# Altium footprint library JL_PCB.PCBLIB: 1129 footprints (part 15 of 72)
Each footprint in its own frame and in the unit in brackets; x right, y up, seen from the top. Pads: shape width x height; smd on the part's side, far side on the other; paste and mask are expansions set on the pad; w line width, h text height; cw(c..) or ccw(c..) is an arc to the next point about the centre after c.
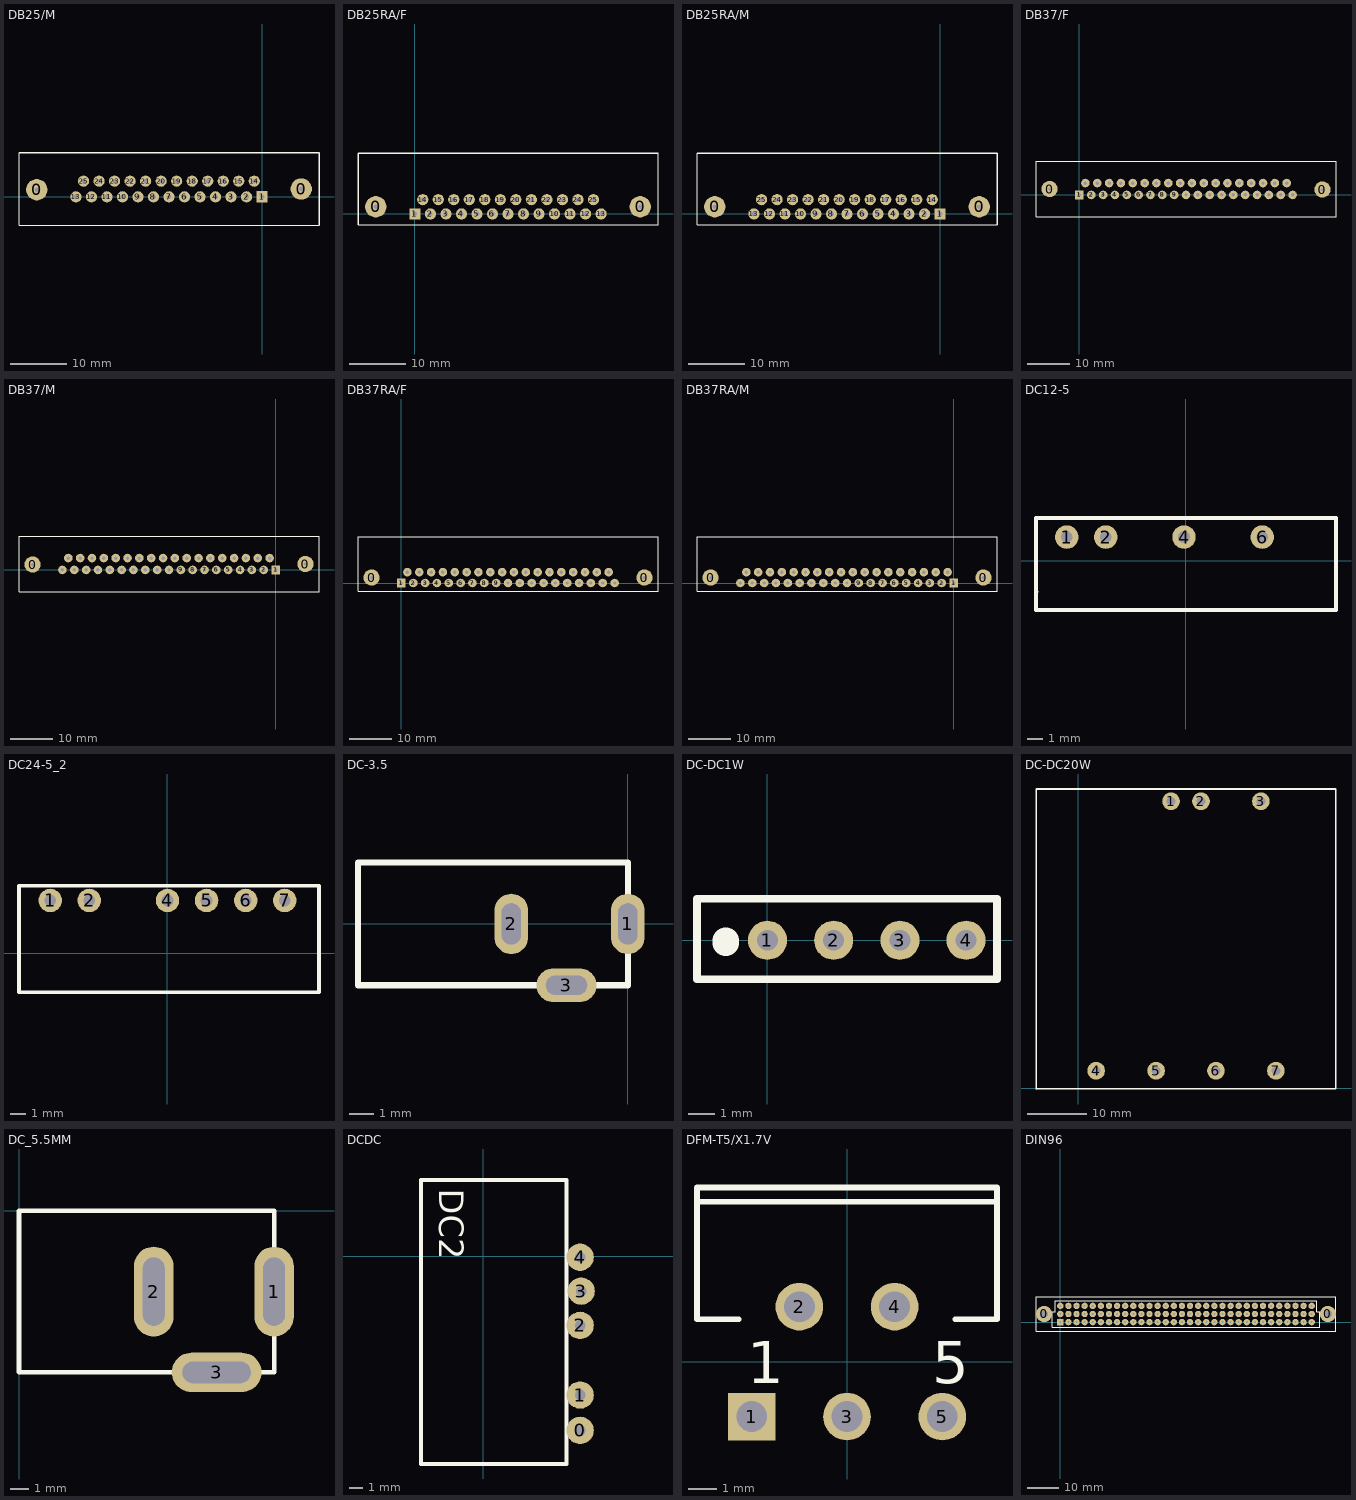
[diagram p14: the footprints below, top view; thin cyan lines are the x and y axes]

## DB25/M [mil]
pads (27):
  round 150 hole 32: 0(-1583,50) 0(275,55)
  rect 78.74x78.74 hole 32: 1(0,0)
  round 78.74 hole 32: 2(-109,0) 3(-218,0) 4(-327,0) 5(-436,0) 6(-545,0) 7(-654,0) 8(-763,0) 9(-872,0) 10(-981,0) 11(-1090,0) 12(-1199,0) 13(-1308,0) 14(-55,110) 15(-164,110) 16(-273,110) 17(-382,110) 18(-491,110) 19(-600,110) 20(-709,110) 21(-818,110) 22(-927,110) 23(-1036,110) 24(-1145,110) 25(-1254,110)
TopOverlay:
  lines w8: -1708,310 -1708,-200 400,-200
  lines w10: -1708,310 400,310 400,-200
3D body "CircuitWorks-DB25_M.step": height 487.22, standoff -137.19, extent -1708.04,-201 412.04,310.81

## DB25RA/F [mil]
pads (27):
  round 150 hole 32: 0(-275,50) 0(1583,50)
  rect 78.74x78.74 hole 32: 1(0,0)
  round 78.74 hole 32: 2(109,0) 3(218,0) 4(327,0) 5(436,0) 6(545,0) 7(654,0) 8(763,0) 9(872,0) 10(981,0) 11(1090,0) 12(1199,0) 13(1308,0) 14(55,100) 15(164,100) 16(273,100) 17(382,100) 18(491,100) 19(600,100) 20(709,100) 21(818,100) 22(927,100) 23(1036,100) 24(1145,100) 25(1254,100)
TopOverlay:
  lines w8: -400,-75 1708,-75 1708,425
  lines w10: -400,-75 -400,425 1708,425
3D body "CircuitWorks-DB25RA_F.step": height 500.6, standoff -99.4, extent -398.99,-64.68 1706.12,659.73

## DB25RA/M [mil]
pads (27):
  round 150 hole 32: 0(-1583,50) 0(275,50)
  rect 78.74x78.74 hole 32: 1(0,0)
  round 78.74 hole 32: 2(-109,0) 3(-218,0) 4(-327,0) 5(-436,0) 6(-545,0) 7(-654,0) 8(-763,0) 9(-872,0) 10(-981,0) 11(-1090,0) 12(-1199,0) 13(-1308,0) 14(-55,100) 15(-164,100) 16(-273,100) 17(-382,100) 18(-491,100) 19(-600,100) 20(-709,100) 21(-818,100) 22(-927,100) 23(-1036,100) 24(-1145,100) 25(-1254,100)
TopOverlay:
  lines w8: -1708,425 -1708,-75 400,-75
  lines w10: -1708,425 400,425 400,-75
3D body "CircuitWorks-DB25RA_M.step": height 500.6, standoff -176.56, extent -1707.56,-69 397.56,655.41

## DB37/F [mil]
pads (39):
  round 150 hole 32: 0(-275,55) 0(2237,50)
  rect 78.74x78.74 hole 32: 1(0,0)
  round 78.74 hole 32: 2(109,0) 3(218,0) 4(327,0) 5(436,0) 6(545,0) 7(654,0) 8(763,0) 9(872,0) 10(981,0) 11(1090,0) 12(1199,0) 13(1308,0) 14(1417,0) 15(1526,0) 16(1635,0) 17(1744,0) 18(1853,0) 19(1962,0) 20(55,110) 21(164,110) 22(273,110) 23(382,110) 24(491,110) 25(600,110) 26(709,110) 27(818,110) 28(927,110) 29(1036,110) 30(1145,110) 31(1254,110) 32(1363,110) 33(1472,110) 34(1581,110) 35(1690,110) 36(1799,110) 37(1908,110)
TopOverlay:
  lines w8: -400,-200 2362,-200 2362,310
  lines w10: -400,-200 -400,310 2362,310

## DB37/M [mil]
pads (39):
  round 150 hole 32: 0(-2237,50) 0(275,55)
  rect 78.74x78.74 hole 32: 1(0,0)
  round 78.74 hole 32: 2(-109,0) 3(-218,0) 4(-327,0) 5(-436,0) 6(-545,0) 7(-654,0) 8(-763,0) 9(-872,0) 10(-981,0) 11(-1090,0) 12(-1199,0) 13(-1308,0) 14(-1417,0) 15(-1526,0) 16(-1635,0) 17(-1744,0) 18(-1853,0) 19(-1962,0) 20(-55,110) 21(-164,110) 22(-273,110) 23(-382,110) 24(-491,110) 25(-600,110) 26(-709,110) 27(-818,110) 28(-927,110) 29(-1036,110) 30(-1145,110) 31(-1254,110) 32(-1363,110) 33(-1472,110) 34(-1581,110) 35(-1690,110) 36(-1799,110) 37(-1908,110)
TopOverlay:
  lines w8: -2362,310 -2362,-200 400,-200
  lines w10: -2362,310 400,310 400,-200
3D body "User Library-DB37.step": height 471.6, standoff -119.4, extent -2348,-197 382,297

## DB37RA/F [mil]
pads (39):
  round 150 hole 32: 0(-275,50) 0(2237,50)
  rect 78.74x78.74 hole 32: 1(0,0)
  round 78.74 hole 32: 2(109,0) 3(218,0) 4(327,0) 5(436,0) 6(545,0) 7(654,0) 8(763,0) 9(872,0) 10(981,0) 11(1090,0) 12(1199,0) 13(1308,0) 14(1417,0) 15(1526,0) 16(1635,0) 17(1744,0) 18(1853,0) 19(1962,0) 20(55,100) 21(164,100) 22(273,100) 23(382,100) 24(491,100) 25(600,100) 26(709,100) 27(818,100) 28(927,100) 29(1036,100) 30(1145,100) 31(1254,100) 32(1363,100) 33(1472,100) 34(1581,100) 35(1690,100) 36(1799,100) 37(1908,100)
TopOverlay:
  lines w8: -400,-75 2362,-75 2362,425
  lines w10: -400,-75 -400,425 2362,425
3D body "CircuitWorks-DB37RA_F.step": height 500.6, standoff -99.4, extent -399.99,-80 2360.01,470

## DB37RA/M [mil]
pads (39):
  round 150 hole 32: 0(-2237,50) 0(275,50)
  rect 78.74x78.74 hole 32: 1(0,0)
  round 78.74 hole 32: 2(-109,0) 3(-218,0) 4(-327,0) 5(-436,0) 6(-545,0) 7(-654,0) 8(-763,0) 9(-872,0) 10(-981,0) 11(-1090,0) 12(-1199,0) 13(-1308,0) 14(-1417,0) 15(-1526,0) 16(-1635,0) 17(-1744,0) 18(-1853,0) 19(-1962,0) 20(-55,100) 21(-164,100) 22(-273,100) 23(-382,100) 24(-491,100) 25(-600,100) 26(-709,100) 27(-818,100) 28(-927,100) 29(-1036,100) 30(-1145,100) 31(-1254,100) 32(-1363,100) 33(-1472,100) 34(-1581,100) 35(-1690,100) 36(-1799,100) 37(-1908,100)
TopOverlay:
  lines w8: -2362,425 -2362,-75 400,-75
  lines w10: -2362,425 400,425 400,-75
3D body "CircuitWorks-DB37M.step": height 500.6, standoff -99.4, extent -2357,-50 385,858

## DC12-5 [mil]
pads (4):
  round 60 hole 30: 1(-305,60) 2(-205,60) 4(-5,60) 6(195,60)
TopOverlay:
  lines w10: -383.74,-78.74 -382.48,-80 ; -383.74,-127.01 383.98,-127.01 383.98,109.21 -383.74,109.21 -383.74,-127.01

## DC24-5_2 [mil]
pads (6):
  round 60 hole 30: 1(-300,135) 2(-200,135) 4(0,135) 5(100,135) 6(200,135) 7(300,135)
TopOverlay:
  lines w10: -380,-100 387.72,-100 387.72,172.72 -380,172.72 -380,-100

## DC-3.5 [mm]
pads (3):
  oval 1.4x2.5 hole 0.8 slot 1.7 at 90 deg: 1(0,0) 2(-4.826,0)
  oval 2.5x1.4 hole 0.8 slot 1.7 at 0 deg: 3(-2.54,-2.54)
TopOverlay:
  lines w0.254: -11.176,-2.54 -11.176,2.54 0,2.54 0,-2.54 -11.176,-2.54
3D body "User Library-DC jack.STEP": height 7.2, standoff -3, extent -11.1,-2.979 0,2.471

## DC-DC1W [mm]
pads (4):
  round 1.5 hole 0.8: 1(0,0) 2(2.54,0) 3(5.08,0) 4(7.62,0)
TopOverlay:
  lines w0.305: -2.702,-1.494 -2.702,1.594 8.804,1.594 8.804,-1.494 -2.702,-1.494
  lines w1: -1.6,-0.1 -1.6,0

## DC-DC20W [mm]
pads (7):
  round 3 hole 1.5: 1(15.748,48.72) 2(20.828,48.72) 3(30.988,48.72) 4(3.048,3) 5(13.208,3) 6(23.368,3) 7(33.528,3)
TopOverlay:
  lines w0.305: -7.118,-0.1 43.688,0 43.688,50.8 -7.112,50.8 -7.118,-0.1

## DC_5.5MM [mm]
pads (3):
  oval 2.2x5 hole 1.2 slot 3.8 at 90 deg: 1(14.2,-4.5) 2(7.5,-4.5)
  oval 5x2.2 hole 1.2 slot 3.8 at 0 deg: 3(11,-9)
TopOverlay:
  lines w0.254: 0,-9 0,0 14.2,0 14.2,-9 0,-9
3D body "DC-3.5.STEP": height 10.82, standoff -4.18, extent -0.102,-8.876 14.098,-0.116

## DCDC [mil]
pads (5):
  round 79 hole 31: 0(279,-503) 1(279,-401) 2(279,-200) 3(282,-101) 4(279,-3)
TopOverlay:
  lines w12: -180,-600 240,-600 240,220 -180,220 -180,-600
  text "DC2" at -128,195 h71

## DFM-T5/X1.7V [mm] "TO, Thru-Hole, Vertical, Heatsink Mounted; 5 Bent Staggered Leads; Pitch 1.7 mm"
height 21.1
pads (5):
  rect 1.7x1.7 hole 1.1: 1(-3.4,-1.96)
  round 1.7 hole 1.1: 2(-1.7,1.96) 3(0,-1.96) 4(1.7,1.96) 5(3.4,-1.96)
TopOverlay:
  lines w0.2: -5.35,5.71 5.35,5.71 ; -3.854,1.51 -5.35,1.51 -5.35,6.21 5.35,6.21 5.35,1.51 3.854,1.51
  text "5" at 3.048,-0.762 h1.5
  text "1" at -3.556,-0.762 h1.5

## DIN96 [mm]
pads (98):
  round 5.08 hole 2.54: 0(-5.08,2.54) 0(83.82,2.54)
  rect 2x2 hole 0.635: 1A(0,0)
  round 2 hole 0.635: 1B(0,2.54) 1C(0,5.08) 2A(2.54,0) 2B(2.54,2.54) 2C(2.54,5.08) 3A(5.08,0) 3B(5.08,2.54) 3C(5.08,5.08) 4A(7.62,0) 4B(7.62,2.54) 4C(7.62,5.08) 5A(10.16,0) 5B(10.16,2.54) 5C(10.16,5.08) 6A(12.7,0) 6B(12.7,2.54) 6C(12.7,5.08) 7A(15.24,0) 7B(15.24,2.54) 7C(15.24,5.08) 8A(17.78,0) 8B(17.78,2.54) 8C(17.78,5.08) 9A(20.32,0) 9B(20.32,2.54) 9C(20.32,5.08) 10A(22.86,0) 10B(22.86,2.54) 10C(22.86,5.08) 11A(25.4,0) 11B(25.4,2.54) 11C(25.4,5.08) 12A(27.94,0) 12B(27.94,2.54) 12C(27.94,5.08) 13A(30.48,0) 13B(30.48,2.54) 13C(30.48,5.08) 14A(33.02,0) 14B(33.02,2.54) 14C(33.02,5.08) 15A(35.56,0) 15B(35.56,2.54) 15C(35.56,5.08) 16A(38.1,0) 16B(38.1,2.54) 16C(38.1,5.08) 17A(40.64,0) 17B(40.64,2.54) 17C(40.64,5.08) 18A(43.18,0) 18B(43.18,2.54) 18C(43.18,5.08) 19A(45.72,0) 19B(45.72,2.54) 19C(45.72,5.08) 20A(48.26,0) 20B(48.26,2.54) 20C(48.26,5.08) 21A(50.8,0) 21B(50.8,2.54) 21C(50.8,5.08) 22A(53.34,0) 22B(53.34,2.54) 22C(53.34,5.08) 23A(55.88,0) 23B(55.88,2.54) 23C(55.88,5.08) 24A(58.42,0) 24B(58.42,2.54) 24C(58.42,5.08) 25A(60.96,0) 25B(60.96,2.54) 25C(60.96,5.08) 26A(63.5,0) 26B(63.5,2.54) 26C(63.5,5.08) 27A(66.04,0) 27B(66.04,2.54) 27C(66.04,5.08) 28A(68.58,0) 28B(68.58,2.54) 28C(68.58,5.08) 29A(71.12,0) 29B(71.12,2.54) 29C(71.12,5.08) 30A(73.66,0) 30B(73.66,2.54) 30C(73.66,5.08) 31A(76.2,0) 31B(76.2,2.54) 31C(76.2,5.08) 32A(78.74,0) 32B(78.74,2.54) 32C(78.74,5.08)
TopOverlay:
  lines w0.254: -7.62,-2.794 86.36,-2.794 86.36,7.874 -7.62,7.874 -7.62,-2.794 ; -2.54,-1.651 81.28,-1.651 81.28,3.302 80.391,3.302 80.391,6.731 -1.651,6.731 -1.651,3.302 -2.54,3.302 -2.54,-1.651